# Altium footprint library PcbLib1.PcbLib: 150 footprints (part 8 of 10)
Each footprint in its own frame and in the unit in brackets; x right, y up, seen from the top. Pads: shape width x height; smd on the part's side, far side on the other; paste and mask are expansions set on the pad; w line width, h text height; cw(c..) or ccw(c..) is an arc to the next point about the centre after c.
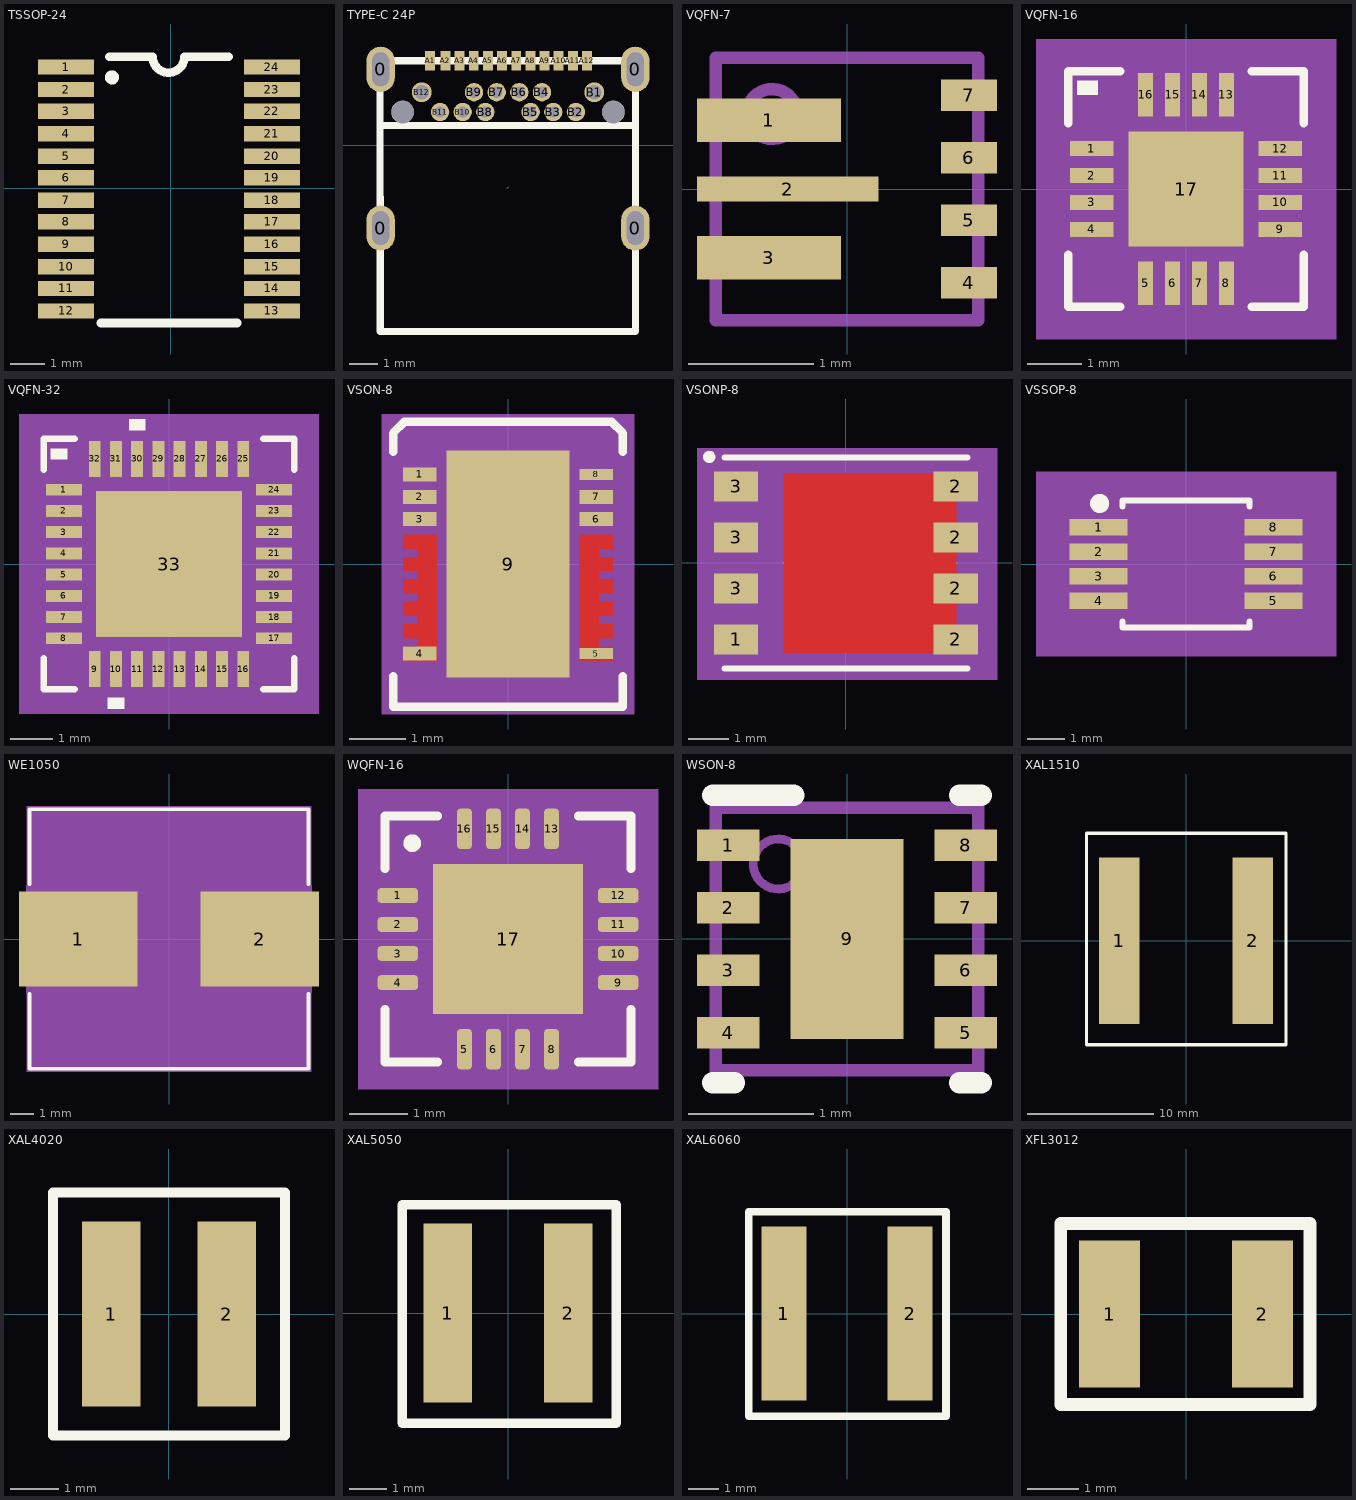
[diagram p7: the footprints below, top view; thin cyan lines are the x and y axes]

## TSSOP-24 [mm]
pads (24):
  rect 1.65x0.45 smd: 1(-3.073,3.556) 2(-3.073,2.896) 3(-3.073,2.261) 4(-3.073,1.6) 5(-3.073,0.94) 6(-3.073,0.305) 7(-3.073,-0.356) 8(-3.073,-0.991) 9(-3.073,-1.651) 10(-3.073,-2.311) 11(-3.073,-2.946) 12(-3.073,-3.607) 13(2.972,-3.607) 14(2.972,-2.946) 15(2.972,-2.311) 16(2.972,-1.651) 17(2.972,-0.991) 18(2.972,-0.356) 19(2.972,0.305) 20(2.972,0.94) 21(2.972,1.6) 22(2.972,2.261) 23(2.972,2.896) 24(2.972,3.556)
Top Overlay:
  circle w0.254: c-1.727,3.251 r0.08
  lines w0.254: -2.058,-3.962 1.957,-3.962 ; -1.803,3.861 -0.533,3.861 ccw(c-0.064,3.861) 0.406,3.861 ; 0.432,3.861 1.702,3.861
3D body "User Library-TSSOP24_(JEDEC_MO-153).STEP": height 1.2, standoff 0, extent -3.354,-3.95 3.202,3.95

## TYPE-C 24P [mm]
pads (30):
  oval 1x1.6 hole 0.6 slot 1.2 at 90 deg: 0(-15.3,-2.929) 0(-15.3,2.681) 0(-6.3,-2.929) 0(-6.3,2.681)
  rect 0.35x0.7 smd: A1(-13.551,2.981) A2(-13.011,2.981) A3(-12.51,2.981) A4(-12.011,2.981) A5(-11.51,2.981) A6(-11.011,2.981) A7(-10.51,2.981) A8(-10.011,2.981) A9(-9.51,2.981) A10(-9.011,2.981) A11(-8.51,2.981) A12(-8.011,2.981)
  round 0.7 hole 0.5: B1(-7.751,1.871) B12(-13.851,1.871)
  round 0.65 hole 0.4: B2(-8.4,1.171) B3(-9.201,1.171) B4(-9.601,1.871) B5(-10,1.171) B6(-10.4,1.871) B7(-11.201,1.871) B8(-11.601,1.171) B9(-12,1.871) B10(-12.4,1.171) B11(-13.201,1.171)
  round 0.8 hole 0.8 unplated: ""(-14.525,1.171) ""(-7.076,1.171)
Top Overlay:
  lines w0.254: -15.322,0.69 -6.291,0.701 ; -15.312,-6.579 -15.322,2.981 -6.281,2.981 ; -15.301,-6.579 -6.301,-6.579 ; -6.291,-6.579 -6.291,3.011 -6.281,3.011
Mechanical 15:
  lines w0.003: -10.826,-1.516 -10.775,-1.465
3D body "usb_31_c.stp": height 3.56, standoff -1.14, extent -15.62,-6.589 -5.97,3.411

## VQFN-7 [mm]
pads (7):
  rect 1.15x0.35 smd paste-0.562 mask+0: 1(-0.625,0.55) 3(-0.625,-0.55)
  rect 1.45x0.2 smd paste-0.712 mask+0: 2(-0.475,0)
  rect 0.45x0.25 smd paste+0 mask+0: 4(0.975,-0.75) 5(0.975,-0.25) 6(0.975,0.25) 7(0.975,0.75)
Top Paste:
  drawing of 6 lines, arcs and shapes, not listed
Mechanical 13:
  circle w0.1: c-0.6,0.6 r0.2
  lines w0.1: -1.05,-1.05 -1.05,1.05 1.05,1.05 1.05,-1.05 -1.05,-1.05
3D body "RWU0007A.stp": height 1, standoff 0, extent -1,-1 1,1
3D body: height 0.25, standoff 0, extent 0,0 0.254,0.254

## VQFN-16 [mm]
pads (17):
  rect 0.8x0.28 smd paste-0.14 mask+0: 1(-1.75,0.75) 2(-1.75,0.25) 3(-1.75,-0.25) 4(-1.75,-0.75) 9(1.75,-0.75) 10(1.75,-0.25) 11(1.75,0.25) 12(1.75,0.75)
  rect 0.28x0.8 smd paste-0.14 mask+0: 5(-0.75,-1.75) 6(-0.25,-1.75) 7(0.25,-1.75) 8(0.75,-1.75) 13(0.75,1.75) 14(0.25,1.75) 15(-0.25,1.75) 16(-0.75,1.75)
  rect 2.14x2.14 smd paste-1.057 mask-1.054: 17(0,0)
Top Overlay:
  region: -2.019,1.753 -2.019,2.007 -1.638,2.007 -1.638,1.753
  lines w0.152: -2.184,-1.221 -2.184,-2.184 -1.221,-2.184 ; -2.184,1.221 -2.184,2.184 -1.221,2.184 ; 1.221,-2.184 2.184,-2.184 2.184,-1.221 ; 1.221,2.184 2.184,2.184 2.184,1.221
Top Paste:
  region: 0.995,-0.494 0.635,-0.494 0.494,-0.635 0.494,-0.995 0.995,-0.995
  region: 0.995,0.294 0.635,0.294 0.494,0.152 0.494,-0.152 0.635,-0.294 0.995,-0.294
  region: 0.995,0.995 0.494,0.995 0.494,0.635 0.635,0.494 0.995,0.494
  region: 0.152,-0.494 -0.152,-0.494 -0.294,-0.635 -0.294,-0.995 0.294,-0.995 0.294,-0.635
  region: 0.152,0.294 -0.152,0.294 -0.294,0.152 -0.294,-0.152 -0.152,-0.294 0.152,-0.294 0.294,-0.152 0.294,0.152
  region: 0.294,0.995 -0.294,0.995 -0.294,0.635 -0.152,0.494 0.152,0.494 0.294,0.635
  region: -0.635,-0.494 -0.995,-0.494 -0.995,-0.995 -0.494,-0.995 -0.494,-0.635
  region: -0.635,0.294 -0.995,0.294 -0.995,-0.294 -0.635,-0.294 -0.494,-0.152 -0.494,0.152
  region: -0.494,0.995 -0.995,0.995 -0.995,0.494 -0.635,0.494 -0.494,0.635
  region: -0.635,2.125 -0.865,2.125 -0.865,1.375 -0.635,1.375
  region: -0.135,2.125 -0.365,2.125 -0.365,1.375 -0.135,1.375
  region: 0.365,2.125 0.135,2.125 0.135,1.375 0.365,1.375
  region: 0.865,2.125 0.635,2.125 0.635,1.375 0.865,1.375
  region: 2.125,0.865 1.375,0.865 1.375,0.635 2.125,0.635
  region: 2.125,0.365 1.375,0.365 1.375,0.135 2.125,0.135
  region: 2.125,-0.135 1.375,-0.135 1.375,-0.365 2.125,-0.365
  region: 2.125,-0.635 1.375,-0.635 1.375,-0.865 2.125,-0.865
  region: 0.865,-1.375 0.635,-1.375 0.635,-2.125 0.865,-2.125
  region: 0.365,-1.375 0.135,-1.375 0.135,-2.125 0.365,-2.125
  region: -0.135,-1.375 -0.365,-1.375 -0.365,-2.125 -0.135,-2.125
  region: -0.635,-1.375 -0.865,-1.375 -0.865,-2.125 -0.635,-2.125
  region: -1.375,-0.635 -2.125,-0.635 -2.125,-0.865 -1.375,-0.865
  region: -1.375,-0.135 -2.125,-0.135 -2.125,-0.365 -1.375,-0.365
  region: -1.375,0.365 -2.125,0.365 -2.125,0.135 -1.375,0.135
  region: -1.375,0.865 -2.125,0.865 -2.125,0.635 -1.375,0.635
Top Solder:
  rectangle: -0.762,-0.864 0.864,0.787
  region: -1.134,-0.194 -1.134,0.194 1.134,0.194 1.134,-0.194
  region: 0.194,-1.134 0.194,1.134 -0.194,1.134 -0.194,-1.134
  region: 0.594,-1.134 0.594,1.134 1.134,1.134 1.134,-1.134
  region: -1.134,-1.134 -1.134,1.134 -0.594,1.134 -0.594,-1.134
  region: -1.134,-1.134 -1.134,-0.594 1.134,-0.594 1.134,-1.134
  region: -1.134,0.594 -1.134,1.134 1.134,1.134 1.134,0.594
  region: -0.54,2.22 -0.96,2.22 -0.96,1.28 -0.54,1.28
  region: -0.04,2.22 -0.46,2.22 -0.46,1.28 -0.04,1.28
  region: 0.46,2.22 0.04,2.22 0.04,1.28 0.46,1.28
  region: 0.96,2.22 0.54,2.22 0.54,1.28 0.96,1.28
  region: 2.22,0.96 1.28,0.96 1.28,0.54 2.22,0.54
  region: 2.22,0.46 1.28,0.46 1.28,0.04 2.22,0.04
  region: 2.22,-0.04 1.28,-0.04 1.28,-0.46 2.22,-0.46
  region: 2.22,-0.54 1.28,-0.54 1.28,-0.96 2.22,-0.96
  region: 0.96,-1.28 0.54,-1.28 0.54,-2.22 0.96,-2.22
  region: 0.46,-1.28 0.04,-1.28 0.04,-2.22 0.46,-2.22
  region: -0.04,-1.28 -0.46,-1.28 -0.46,-2.22 -0.04,-2.22
  region: -0.54,-1.28 -0.96,-1.28 -0.96,-2.22 -0.54,-2.22
  region: -1.28,-0.54 -2.22,-0.54 -2.22,-0.96 -1.28,-0.96
  region: -1.28,-0.04 -2.22,-0.04 -2.22,-0.46 -1.28,-0.46
  region: -1.28,0.46 -2.22,0.46 -2.22,0.04 -1.28,0.04
  region: -1.28,0.96 -2.22,0.96 -2.22,0.54 -1.28,0.54
Mechanical 5:
  region: 2.785,-2.785 -2.785,-2.785 -2.785,2.785 2.785,2.785
Mechanical 13:
  lines w0.025: -1.803,0.533 -0.533,1.803 ; -1.803,-1.803 -1.803,1.803 1.803,1.803 1.803,-1.803 -1.803,-1.803
Mechanical 15:
  region: -1.144,-2.057 -2.057,-2.057 -2.057,-1.144 -2.404,-1.144 -2.404,1.144 -2.057,1.144 -2.057,2.057 -1.144,2.057 -1.144,2.404 1.144,2.404 1.144,2.057 2.057,2.057 2.057,1.144 2.404,1.144 2.404,-1.144 2.057,-1.144 2.057,-2.057 1.144,-2.057 1.144,-2.404 -1.144,-2.404
  lines w0.152: -2.404,-1.144 -2.404,1.144 -2.057,1.144 -2.057,2.057 -1.144,2.057 -1.144,2.404 1.144,2.404 1.144,2.057 2.057,2.057 2.057,1.144 2.404,1.144 2.404,-1.144 2.057,-1.144 2.057,-2.057 1.144,-2.057 1.144,-2.404 -1.144,-2.404 -1.144,-2.057 -2.057,-2.057 -2.057,-1.144 -2.404,-1.144
Mechanical 16:
  circle w0.127: c0.394,0.394 r0.191
  circle w0.127: c0.394,-0.394 r0.191
  circle w0.127: c-0.394,0.394 r0.191
  circle w0.127: c-0.394,-0.394 r0.191
3D body "RVA16_2P14X2P14.step": height 1.4, standoff 0, extent -1.854,-1.854 1.854,1.854
3D body: height 0.25, standoff 0, extent 0,0 0.254,0.254

## VQFN-32 [mm]
pads (33):
  rect 0.85x0.28 smd paste-0.14 mask+0: 1(-2.475,1.75) 2(-2.475,1.25) 3(-2.475,0.75) 4(-2.475,0.25) 5(-2.475,-0.25) 6(-2.475,-0.75) 7(-2.475,-1.25) 8(-2.475,-1.75) 17(2.475,-1.75) 18(2.475,-1.25) 19(2.475,-0.75) 20(2.475,-0.25) 21(2.475,0.25) 22(2.475,0.75) 23(2.475,1.25) 24(2.475,1.75)
  rect 0.28x0.85 smd paste-0.14 mask+0: 9(-1.75,-2.475) 10(-1.25,-2.475) 11(-0.75,-2.475) 12(-0.25,-2.475) 13(0.25,-2.475) 14(0.75,-2.475) 15(1.25,-2.475) 16(1.75,-2.475) 25(1.75,2.475) 26(1.25,2.475) 27(0.75,2.475) 28(0.25,2.475) 29(-0.25,2.475) 30(-0.75,2.475) 31(-1.25,2.475) 32(-1.75,2.475)
  rect 3.45x3.45 smd paste-1.712 mask-1.714: 33(0,0)
Top Overlay:
  region: -1.06,-3.154 -1.441,-3.154 -1.441,-3.408 -1.06,-3.408
  region: -2.781,2.464 -2.781,2.718 -2.4,2.718 -2.4,2.464
  region: -0.56,3.154 -0.941,3.154 -0.941,3.408 -0.56,3.408
  lines w0.152: -2.956,-2.218 -2.956,-2.956 -2.218,-2.956 ; -2.956,2.218 -2.956,2.956 -2.218,2.956 ; 2.218,-2.956 2.956,-2.956 2.956,-2.218 ; 2.218,2.956 2.956,2.956 2.956,2.218
Top Paste:
  drawing of 57 lines, arcs and shapes, not listed
Top Solder:
  drawing of 42 lines, arcs and shapes, not listed
Mechanical 5:
  region: 3.535,-3.535 -3.535,-3.535 -3.535,3.535 3.535,3.535
Mechanical 13:
  lines w0.025: -2.575,1.305 -1.305,2.575 ; -2.575,-2.575 2.575,-2.575 2.575,2.575 -2.575,2.575 -2.575,-2.575
  text "*" at -2.114,1.365 h1.27
Mechanical 15:
  region: -2.144,-2.829 -2.829,-2.829 -2.829,-2.144 -3.154,-2.144 -3.154,2.144 -2.829,2.144 -2.829,2.829 -2.144,2.829 -2.144,3.154 2.144,3.154 2.144,2.829 2.829,2.829 2.829,2.144 3.154,2.144 3.154,-2.144 2.829,-2.144 2.829,-2.829 2.144,-2.829 2.144,-3.154 -2.144,-3.154
  lines w0.152: -3.154,-2.144 -2.829,-2.144 -2.829,-2.829 -2.144,-2.829 -2.144,-3.154 2.144,-3.154 2.144,-2.829 2.829,-2.829 2.829,-2.144 3.154,-2.144 3.154,2.144 2.829,2.144 2.829,2.829 2.144,2.829 2.144,3.154 -2.144,3.154 -2.144,2.829 -2.829,2.829 -2.829,2.144 -3.154,2.144 -3.154,-2.144
3D body: height 0.25, standoff 0, extent 0,0 0.254,0.254
3D body "RHB32_3P45X3P45.step": height 1.4, standoff 0, extent -2.626,-2.626 2.626,2.626

## VSON-8 [mm]
pads (9):
  rect 0.6x0.25 smd paste-0.125: 1(-1.575,1.6) 2(-1.575,1.2) 3(-1.575,0.8) 4(-1.575,-1.6) 6(1.575,0.8) 7(1.575,1.2)
  rect 0.6x0.2 smd paste-0.125: 5(1.575,-1.6) 8(1.575,1.6)
  rect 2.2x4.05 smd paste-2.012 mask-2.007: 9(0,0)
Top Layer:
  region: 0,-2.025
  region: 0,2.025
  region: -1.626,0.525 -1.275,0.525 -1.275,-1.725 -1.626,-1.725
  region: -1.575,0.525 -1.275,0.525 -1.275,-1.725 -1.575,-1.725
  region: 1.626,0.525 1.275,0.525 1.275,-1.725 1.626,-1.725
  region: 1.875,-1.475 1.275,-1.475 1.275,-1.725 1.875,-1.725
  region: 1.875,-1.075 1.275,-1.075 1.275,-1.325 1.875,-1.325
  region: 1.875,-0.675 1.275,-0.675 1.275,-0.925 1.875,-0.925
  region: 1.875,-0.275 1.275,-0.275 1.275,-0.525 1.875,-0.525
  region: 1.875,0.125 1.275,0.125 1.275,-0.125 1.875,-0.125
  region: 1.875,0.525 1.275,0.525 1.275,0.275 1.875,0.275
  region: -1.275,-1.475 -1.875,-1.475 -1.875,-1.725 -1.275,-1.725
  region: -1.275,-1.075 -1.875,-1.075 -1.875,-1.325 -1.275,-1.325
  region: -1.275,-0.675 -1.875,-0.675 -1.875,-0.925 -1.275,-0.925
  region: -1.275,-0.275 -1.875,-0.275 -1.875,-0.525 -1.275,-0.525
  region: -1.275,0.125 -1.875,0.125 -1.875,-0.125 -1.275,-0.125
  region: -1.275,0.525 -1.875,0.525 -1.875,0.275 -1.275,0.275
Top Overlay:
  lines w0.152: -2.054,-2.008 -2.054,-2.554 2.054,-2.554 2.054,-2.008 ; -2.054,2.008 -2.054,2.34 -1.854,2.54 1.854,2.54 2.054,2.34 2.054,2.008
Top Paste:
  region: 1.6,-1.492 1.6,-1.692 1.715,-1.692 1.715,-1.492
  region: 1.6,-1.292 1.6,-1.092 1.715,-1.092 1.715,-1.292
  region: 1.6,-0.692 1.6,-0.892 1.715,-0.892 1.715,-0.692
  region: 1.6,-0.492 1.6,-0.292 1.715,-0.292 1.715,-0.492
  region: 1.6,0.308 1.6,0.508 1.715,0.508 1.715,0.308
  region: -0.15,-1.927 -1,-1.927 -1,-1.189 -0.15,-1.189
  region: 0.15,-0.151 1,-0.151 1,-0.889 0.15,-0.889
  region: 0.15,-0.151 1,-0.151 1,-0.889 0.15,-0.889
  region: 0.15,-0.151 1,-0.151 1,-0.889 0.15,-0.889
  region: 1.6,-1.292 1.6,-1.092 1.715,-1.092 1.715,-1.292
  region: -0.15,-0.151 -1,-0.151 -1,-0.889 -0.15,-0.889
  region: -0.15,0.149 -1,0.149 -1,0.887 -0.15,0.887
  region: -0.15,0.149 -1,0.149 -1,0.887 -0.15,0.887
  region: 0.15,0.149 1,0.149 1,0.887 0.15,0.887
  region: -0.15,1.925 -1,1.925 -1,1.187 -0.15,1.187
  region: -0.15,1.925 -1,1.925 -1,1.187 -0.15,1.187
  region: 0.15,-1.927 1,-1.927 1,-1.189 0.15,-1.189
  region: 0.15,1.925 1,1.925 1,1.187 0.15,1.187
  region: 1.875,1.725 1.275,1.725 1.275,1.475 1.875,1.475
  region: 1.875,1.325 1.275,1.325 1.275,1.075 1.875,1.075
  region: 1.875,0.925 1.275,0.925 1.275,0.675 1.875,0.675
  region: 1.6,-0.692 1.6,-0.892 1.715,-0.892 1.715,-0.692
  region: 1.6,-0.492 1.6,-0.292 1.715,-0.292 1.715,-0.492
  region: -1.6,0.108 -1.6,-0.092 -1.715,-0.092 -1.715,0.108
  region: 1.6,0.308 1.6,0.508 1.715,0.508 1.715,0.308
  region: 1.6,-1.492 1.6,-1.692 1.715,-1.692 1.715,-1.492
  region: -1.6,-1.292 -1.6,-1.092 -1.715,-1.092 -1.715,-1.292
  region: -1.6,-0.692 -1.6,-0.892 -1.715,-0.892 -1.715,-0.692
  region: -1.6,-0.492 -1.6,-0.292 -1.715,-0.292 -1.715,-0.492
  region: 1.6,0.108 1.6,-0.092 1.715,-0.092 1.715,0.108
  region: -1.6,0.308 -1.6,0.508 -1.715,0.508 -1.715,0.308
  region: -1.6,-1.492 -1.6,-1.692 -1.715,-1.692 -1.715,-1.492
  region: 1.346,0.508 1.6,0.508 1.6,-1.692 1.346,-1.692
  region: -1.275,0.925 -1.875,0.925 -1.875,0.675 -1.275,0.675
  region: -1.275,1.325 -1.875,1.325 -1.875,1.075 -1.275,1.075
  region: -1.275,1.725 -1.875,1.725 -1.875,1.475 -1.275,1.475
  region: -1.6,0.508 -1.346,0.508 -1.346,-1.692 -1.6,-1.692
Top Solder:
  region: 0,-2.025
  region: 0,2.025
  region: 0.594,-2.088 0.594,2.088 1.164,2.088 1.164,-2.088
  region: 0.194,-2.088 0.194,2.088 -0.194,2.088 -0.194,-2.088
  region: -1.164,-2.088 -1.164,2.088 -0.594,2.088 -0.594,-2.088
  region: -1.164,-2.088 -1.164,-1.775 1.164,-1.775 1.164,-2.088
  region: -1.164,-1.375 -1.164,-0.987 1.164,-0.987 1.164,-1.375
  region: -1.164,-0.587 -1.164,-0.2 1.164,-0.2 1.164,-0.587
  region: -1.164,0.2 -1.164,0.587 1.164,0.587 1.164,0.2
  region: -1.164,0.987 -1.164,1.375 1.164,1.375 1.164,0.987
  region: -1.164,1.775 -1.164,2.088 1.164,2.088 1.164,1.775
  region: 1.875,1.725 1.275,1.725 1.275,1.475 1.875,1.475
  region: 1.875,1.325 1.275,1.325 1.275,1.075 1.875,1.075
  region: 1.875,0.925 1.275,0.925 1.275,0.675 1.875,0.675
  region: 1.875,0.525 1.275,0.525 1.275,0.275 1.875,0.275
  region: 1.875,0.125 1.275,0.125 1.275,-0.125 1.875,-0.125
  region: 1.875,-0.275 1.275,-0.275 1.275,-0.525 1.875,-0.525
  region: 1.875,-0.675 1.275,-0.675 1.275,-0.925 1.875,-0.925
  region: 1.875,-1.075 1.275,-1.075 1.275,-1.325 1.875,-1.325
  region: 1.875,-1.475 1.275,-1.475 1.275,-1.725 1.875,-1.725
  region: -1.275,-1.475 -1.875,-1.475 -1.875,-1.725 -1.275,-1.725
  region: -1.275,-1.075 -1.875,-1.075 -1.875,-1.325 -1.275,-1.325
  region: -1.275,-0.675 -1.875,-0.675 -1.875,-0.925 -1.275,-0.925
  region: -1.275,-0.275 -1.875,-0.275 -1.875,-0.525 -1.275,-0.525
  region: -1.275,0.125 -1.875,0.125 -1.875,-0.125 -1.275,-0.125
  region: -1.275,0.525 -1.875,0.525 -1.875,0.275 -1.275,0.275
  region: -1.275,0.925 -1.875,0.925 -1.875,0.675 -1.275,0.675
  region: -1.275,1.325 -1.875,1.325 -1.875,1.075 -1.275,1.075
  region: -1.275,1.725 -1.875,1.725 -1.875,1.475 -1.275,1.475
Mechanical 5:
  region: 2.256,-2.681 -2.256,-2.681 -2.256,2.681 2.256,2.681
Mechanical 13:
  circle w0: c-2.176,1.6 r0.076
  lines w0: -0.305,2.3 ccw(c0,2.3) 0.305,2.3
  lines w0.025: -1.8,-2.3 -1.8,2.3 1.8,2.3 1.8,-2.3 -1.8,-2.3
Mechanical 15:
  region: 2.129,-2.554 -2.129,-2.554 -2.129,2.554 2.129,2.554
  lines w0.152: -2.129,-2.554 -2.129,2.554 2.129,2.554 2.129,-2.554 -2.129,-2.554
3D body "DPC0008A.stp": height 0.77, standoff 0, extent -1.75,-2.25 1.75,2.25
3D body: height 0.25, standoff 0, extent 0,0 0.254,0.254

## VSONP-8 [mm]
pads (8):
  rect 1.1x0.75 smd paste-0.1: 1(-2.735,-1.905) 2(2.735,-1.905) 2(2.735,-0.635) 2(2.735,0.635) 2(2.735,1.905) 3(-2.735,-0.635) 3(-2.735,0.635) 3(-2.735,1.905)
Top Layer:
  region: 2.745,0 2.745,-2.23 -1.545,-2.23 -1.545,0
  region: 2.745,0 2.745,2.23 -1.545,2.23 -1.545,0
Top Overlay:
  circle w0.152: c-3.404,2.642 r0.076
  lines w0.152: -3.027,-2.627 3.027,-2.627 ; -3.027,2.627 3.027,2.627
Top Paste:
  region: -0.18,-1.88 -0.18,-0.31 -1.415,-0.31 -1.415,-1.88
  region: -0.18,1.88 -0.18,0.31 -1.415,0.31 -1.415,1.88
  region: 0.32,1.88 0.32,0.31 1.905,0.31 1.905,1.88
  region: 0.32,-1.88 0.32,-0.31 1.905,-0.31 1.905,-1.88
Top Solder:
  region: 2.745,0 2.745,-2.23 -1.545,-2.23 -1.545,0
  region: 2.745,0 2.745,2.23 -1.545,2.23 -1.545,0
  region: 3.12,2.3 2.35,2.3 2.35,1.51 3.12,1.51
  region: 3.12,1.03 2.35,1.03 2.35,0.24 3.12,0.24
  region: 3.12,-0.24 2.35,-0.24 2.35,-1.03 3.12,-1.03
  region: 3.12,-1.51 2.35,-1.51 2.35,-2.3 3.12,-2.3
  region: -2.35,-1.51 -3.12,-1.51 -3.12,-2.3 -2.35,-2.3
  region: -2.35,-0.24 -3.12,-0.24 -3.12,-1.03 -2.35,-1.03
  region: -2.35,1.03 -3.12,1.03 -3.12,0.24 -2.35,0.24
  region: -2.35,2.3 -3.12,2.3 -3.12,1.51 -2.35,1.51
Mechanical 5:
  region: 3.763,-2.906 -3.708,-2.906 -3.708,2.856 3.763,2.856
Mechanical 13:
  circle w0: c-2.725,1.905 r0.076
  lines w0: -0.305,2.5 ccw(c0,2.5) 0.305,2.5
  lines w0.025: -2.9,-2.5 -2.9,2.5 2.9,2.5 2.9,-2.5 -2.9,-2.5
Mechanical 15:
  region: -3.154,-2.591 -3.609,-2.591 -3.609,2.591 -3.154,2.591 -3.154,2.754 3.154,2.754 3.154,2.591 3.609,2.591 3.609,-2.591 3.154,-2.591 3.154,-2.754 -3.154,-2.754
  lines w0.152: -3.609,-2.591 -3.154,-2.591 -3.154,-2.754 3.154,-2.754 3.154,-2.591 3.609,-2.591 3.609,2.591 3.154,2.591 3.154,2.754 -3.154,2.754 -3.154,2.591 -3.609,2.591 -3.609,-2.591
3D body "DQJ0008A.stp": height 1.15, standoff 0, extent -3.13,-2.45 3.13,2.45
3D body: height 0.25, standoff 0, extent 0,0 0.254,0.254

## VSSOP-8 [mm]
pads (8):
  rect 1.528x0.431 smd paste+0 mask+0: 1(-2.313,0.975) 2(-2.313,0.325) 3(-2.313,-0.325) 4(-2.313,-0.975) 5(2.313,-0.975) 6(2.313,-0.325) 7(2.313,0.325) 8(2.313,0.975)
Top Overlay:
  circle w0.254: c-2.286,1.6 r0.127
  lines w0.152: -1.676,-1.523 -1.676,-1.676 1.676,-1.676 1.676,-1.523 ; -1.676,1.523 -1.676,1.676 1.676,1.676 1.676,1.523
Mechanical 5:
  region: 3.966,-2.438 -3.966,-2.438 -3.966,2.438 3.966,2.438
Mechanical 13:
  lines w0: -0.305,1.549 ccw(c0,1.549) 0.305,1.549
  lines w0.025: -2.527,-1.165 -1.549,-1.165 -1.549,-0.784 -2.527,-0.784 -2.527,-1.165 ; -2.527,-0.516 -1.549,-0.516 -1.549,-0.135 -2.527,-0.135 -2.527,-0.516 ; -2.527,0.135 -1.549,0.135 -1.549,0.516 -2.527,0.516 -2.527,0.135 ; -2.527,0.784 -1.549,0.784 -1.549,1.165 -2.527,1.165 -2.527,0.784 ; -1.549,-1.549 -1.549,1.549 1.549,1.549 1.549,-1.549 -1.549,-1.549 ; 1.549,-1.165 2.527,-1.165 2.527,-0.784 1.549,-0.784 1.549,-1.165 ; 1.549,-0.516 2.527,-0.516 2.527,-0.135 1.549,-0.135 1.549,-0.516 ; 1.549,0.135 2.527,0.135 2.527,0.516 1.549,0.516 1.549,0.135 ; 1.549,0.784 2.527,0.784 2.527,1.165 1.549,1.165 1.549,0.784
  text "*" at -1.486,0.203 h1.27
Mechanical 15:
  region: -2.057,-1.699 -3.585,-1.699 -3.585,1.699 -2.057,1.699 -2.057,2.057 2.057,2.057 2.057,1.699 3.585,1.699 3.585,-1.699 2.057,-1.699 2.057,-2.057 -2.057,-2.057
  lines w0.152: -3.585,-1.699 -2.057,-1.699 -2.057,-2.057 2.057,-2.057 2.057,-1.699 3.585,-1.699 3.585,1.699 2.057,1.699 2.057,2.057 -2.057,2.057 -2.057,1.699 -3.585,1.699 -3.585,-1.699
3D body: height 0.25, standoff 0, extent 0,0 0.254,0.254
3D body "DGK8.step": height 1.09, standoff 0, extent -2.527,-1.549 2.527,1.549

## WE1050 [mm]
pads (2):
  rect 5x4.013 smd paste+0 mask+0: 1(-3.825,0) 2(3.825,0)
Top Overlay:
  lines w0.152: -5.88,-2.315 -5.88,-5.474 5.88,-5.474 5.88,-2.315 ; -5.88,2.315 -5.88,5.474 5.88,5.474 5.88,2.315
Mechanical 5:
  region: 5.946,-5.537 -5.946,-5.537 -5.946,5.537 5.946,5.537
Mechanical 15:
  region: -6.007,-2.261 -6.009,-2.261 -6.009,2.261 -6.007,2.261 -6.007,5.601 6.007,5.601 6.007,2.261 6.009,2.261 6.009,-2.261 6.007,-2.261 6.007,-5.601 -6.007,-5.601
3D body "744325240.step": height 5.05, standoff 0, extent -5.753,-5.22 5.753,5.474
3D body: height 0.25, standoff 0, extent 0,0 0.254,0.254

## WQFN-16 [mm]
pads (17):
  rrect50% 0.7x0.254 smd paste+0 mask+0.051: 1(-1.9,0.75) 2(-1.9,0.25) 3(-1.9,-0.25) 4(-1.9,-0.75) 9(1.9,-0.75) 10(1.9,-0.25) 11(1.9,0.25) 12(1.9,0.75)
  rrect50% 0.254x0.7 smd paste+0 mask+0.051: 5(-0.75,-1.9) 6(-0.25,-1.9) 7(0.25,-1.9) 8(0.75,-1.9) 13(0.75,1.9) 14(0.25,1.9) 15(-0.25,1.9) 16(-0.75,1.9)
  rect 2.591x2.591 smd paste-1.283 mask+0: 17(0,0)
Top Overlay:
  circle w0.152: c-1.651,1.651 r0.076
  lines w0.152: -2.121,-1.21 -2.121,-2.121 -1.21,-2.121 ; -2.121,1.21 -2.121,2.121 -1.21,2.121 ; 1.21,-2.121 2.121,-2.121 2.121,-1.21 ; 1.21,2.121 2.121,2.121 2.121,1.21
Top Paste:
  drawing of 16 lines, arcs and shapes, not listed
Top Solder:
  region: 0.987,-1.359 0.987,1.359 1.359,1.359 1.359,-1.359
  region: 0.587,-1.359 0.587,1.359 0.2,1.359 0.2,-1.359
  region: -0.2,-1.359 -0.2,1.359 -0.587,1.359 -0.587,-1.359
  region: -1.359,-1.359 -1.359,1.359 -0.987,1.359 -0.987,-1.359
  region: -1.359,-1.359 -1.359,-0.987 1.359,-0.987 1.359,-1.359
  region: -1.359,-0.587 -1.359,-0.2 1.359,-0.2 1.359,-0.587
  region: -1.359,0.2 -1.359,0.587 1.359,0.587 1.359,0.2
  region: -1.359,0.987 -1.359,1.359 1.359,1.359 1.359,0.987
Mechanical 5:
  region: -2.586,2.586 2.586,2.586 2.586,-2.586 -2.586,-2.586
Mechanical 13:
  circle w0: c-1.849,0.75 r0.076
  lines w0.025: -1.994,0.724 -0.724,1.994 ; -1.994,-1.994 -1.994,1.994 1.994,1.994 1.994,-1.994 -1.994,-1.994
Mechanical 15:
  region: -1.258,-2.248 -2.248,-2.248 -2.248,-1.258 -2.459,-1.258 -2.459,1.258 -2.248,1.258 -2.248,2.248 -1.258,2.248 -1.258,2.459 1.258,2.459 1.258,2.248 2.248,2.248 2.248,1.258 2.459,1.258 2.459,-1.258 2.248,-1.258 2.248,-2.248 1.258,-2.248 1.258,-2.459 -1.258,-2.459
  lines w0.152: -2.459,-1.258 -2.459,1.258 -2.248,1.258 -2.248,2.248 -1.258,2.248 -1.258,2.459 1.258,2.459 1.258,2.248 2.248,2.248 2.248,1.258 2.459,1.258 2.459,-1.258 2.248,-1.258 2.248,-2.248 1.258,-2.248 1.258,-2.459 -1.258,-2.459 -1.258,-2.248 -2.248,-2.248 -2.248,-1.258 -2.459,-1.258
Mechanical 16:
  circle w0: c1,0 r0.102
  circle w0: c0,1 r0.102
  circle w0: c0,0 r0.102
  circle w0: c0,-1 r0.102
  circle w0: c-1,0 r0.102
3D body "RGH0016A.stp": height 0.77, standoff -0.03, extent -2,-2 2,2
3D body: height 0.25, standoff 0, extent 0,0 0.254,0.254

## WSON-8 [mm]
pads (9):
  rect 0.5x0.25 smd paste+0 mask+0.051: 1(-0.95,0.75) 2(-0.95,0.25) 3(-0.95,-0.25) 4(-0.95,-0.75) 5(0.95,-0.75) 6(0.95,-0.25) 7(0.95,0.25) 8(0.95,0.75)
  rect 0.9x1.6 smd paste-0.45 mask+0.051: 9(0,0)
Top Overlay:
  lines w0.17: -1.075,-1.15 -0.9,-1.15 ; -1.075,1.15 -0.425,1.15 ; 0.9,-1.15 1.075,-1.15 ; 0.9,1.15 1.075,1.15
Top Paste:
  region: -0.449,0.139 -0.45,0.149 -0.45,0.751 -0.449,0.761 -0.446,0.77 -0.442,0.778 -0.436,0.786 -0.428,0.792 -0.42,0.796 -0.411,0.799 -0.401,0.8 0.401,0.8 0.411,0.799 0.42,0.796 0.428,0.792 0.436,0.786 0.442,0.778 0.446,0.77 0.449,0.761 0.45,0.751 0.45,0.149 0.449,0.139 0.446,0.13 0.442,0.122 0.436,0.114 0.428,0.108 0.42,0.104 0.411,0.101 0.401,0.1 -0.401,0.1 -0.411,0.101 -0.42,0.104 -0.428,0.108 -0.436,0.114 -0.442,0.122 -0.446,0.13
  region: -0.449,-0.761 -0.45,-0.751 -0.45,-0.149 -0.449,-0.139 -0.446,-0.13 -0.442,-0.122 -0.436,-0.114 -0.428,-0.108 -0.42,-0.104 -0.411,-0.101 -0.401,-0.1 0.401,-0.1 0.411,-0.101 0.42,-0.104 0.428,-0.108 0.436,-0.114 0.442,-0.122 0.446,-0.13 0.449,-0.139 0.45,-0.149 0.45,-0.751 0.449,-0.761 0.446,-0.77 0.442,-0.778 0.436,-0.786 0.428,-0.792 0.42,-0.796 0.411,-0.799 0.401,-0.8 -0.401,-0.8 -0.411,-0.799 -0.42,-0.796 -0.428,-0.792 -0.436,-0.786 -0.442,-0.778 -0.446,-0.77
Mechanical 13:
  circle w0.07: c-0.55,0.6 r0.2
  lines w0.1: -1.05,-1.05 -1.05,1.05 1.05,1.05 1.05,-1.05 -1.05,-1.05
3D body: height 0.25, standoff 0, extent 0,0 0.254,0.254
3D body "DSG0008A.stp": height 0.77, standoff 0, extent -1,-1 1,1

## XAL1510 [mm]
pads (2):
  rect 3.188x13.2 smd paste+0 mask+0: 1(-5.3,0) 2(5.3,0)
Top Overlay:
  lines w0.254: -7.899,-8.255 -7.899,8.509 -7.62,8.509 7.925,8.509 7.925,-8.255 -7.899,-8.255
3D body "Coilcraft-XAL1510-333.STEP": height 10.7, standoff -0.3, extent -7.7,-8.073 7.7,8.327

## XAL4020 [mm]
pads (2):
  rect 1.2x3.8 smd: 1(-1.185,0) 2(1.185,0)
Top Overlay:
  lines w0.2: -2.385,-2.5 -2.385,0 -2.385,2.5 2.385,2.5 2.385,-2.5 -2.385,-2.5
3D body "Coilcraft-XAL4020.SLDPRT": height 2, standoff -0.1, extent -2.15,-2.15 2.15,2.15

## XAL5050 [mm]
pads (2):
  rect 1.3x4.8 smd: 1(-1.62,0) 2(1.62,0)
Top Overlay:
  lines w0.254: -2.84,-2.946 2.9,-2.946 2.9,2.9 -2.84,2.9 -2.84,-2.946
3D body "Coilcraft-XAL5050.STEP": height 5, standoff -0.1, extent -2.714,-2.891 2.766,2.789

## XAL6060 [mm]
pads (2):
  rect 1.5x5.8 smd: 1(-2.1,0) 2(2.1,0)
Top Overlay:
  lines w0.254: 3.3,-3.425 -3.279,-3.425 -3.279,3.4 3.3,3.4 3.3,-3.4
3D body "Coilcraft-XAL6060.STEP": height 6, standoff -0.1, extent -3.28,-3.456 3.28,3.304

## XFL3012 [mm]
pads (2):
  rect 1.2x2.9 smd: 1(-1.5,0) 2(1.5,0)
Top Overlay:
  lines w0.254: -2.464,-1.778 2.438,-1.778 2.438,1.778 -2.159,1.778 -2.464,1.778 -2.464,-1.778
3D body "Coilcraft-XFL3012.STEP": height 1.25, standoff -0.05, extent -1.6,-1.651 1.6,1.549